# Altium footprint library con-amp.PCBLIB: 295 footprints (part 19 of 19)
Each footprint in its own frame and in the unit in brackets; x right, y up, seen from the top. Pads: shape width x height; smd on the part's side, far side on the other; paste and mask are expansions set on the pad; w line width, h text height; cw(c..) or ccw(c..) is an arc to the next point about the centre after c.
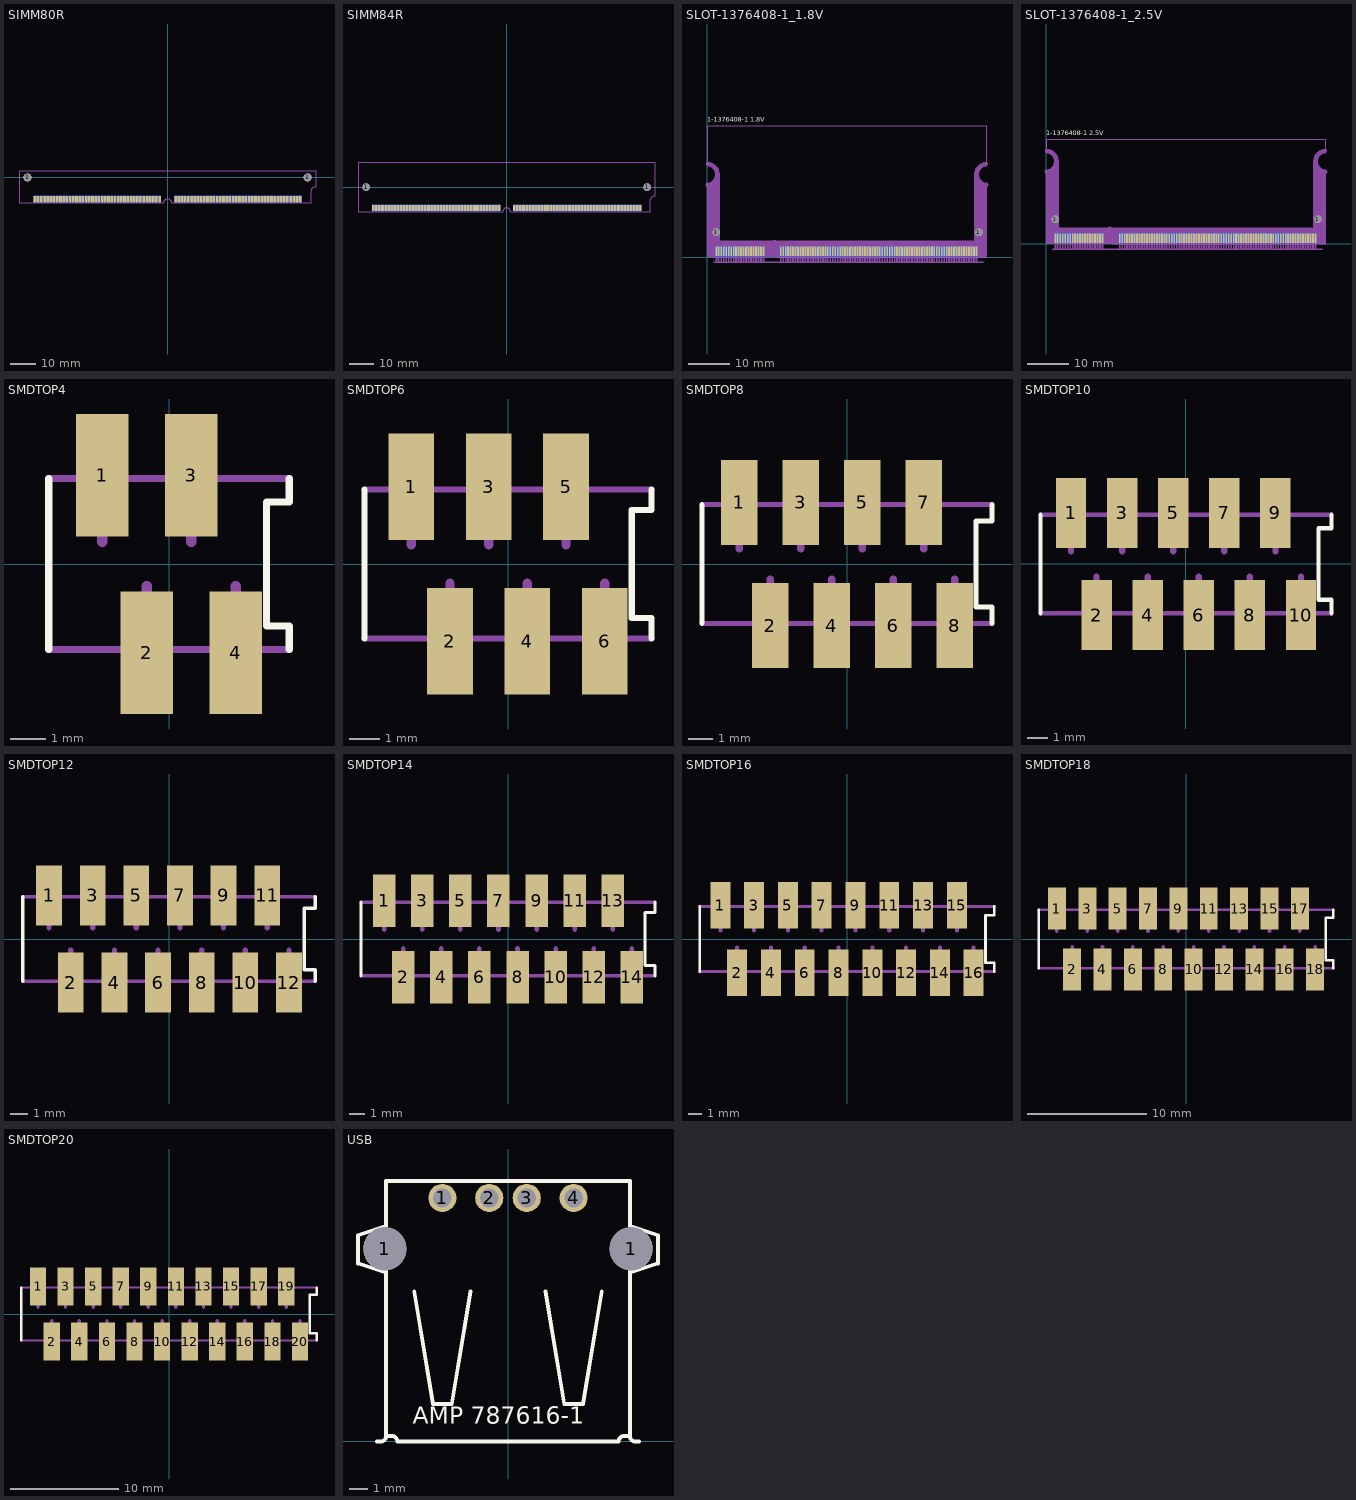
[diagram p18: the footprints below, top view; thin cyan lines are the x and y axes]

## SIMM80R [mil]
pads (162):
  round 125 hole 125: 1(-2192,0) 1(2192,0)
  rect 41x100 smd: 1(2075,-340) 2(2025,-340) 3(1975,-340) 4(1925,-340) 5(1875,-340) 6(1825,-340) 7(1775,-340) 8(1725,-340) 9(1675,-340) 10(1625,-340) 11(1575,-340) 12(1525,-340) 13(1475,-340) 14(1425,-340) 15(1375,-340) 16(1325,-340) 17(1275,-340) 18(1225,-340) 19(1175,-340) 20(1125,-340) 21(1075,-340) 22(1025,-340) 23(975,-340) 24(925,-340) 25(875,-340) 26(825,-340) 27(775,-340) 28(725,-340) 29(675,-340) 30(625,-340) 31(575,-340) 32(525,-340) 33(475,-340) 34(425,-340) 35(375,-340) 36(325,-340) 37(275,-340) 38(225,-340) 39(175,-340) 40(125,-340) 41(-125,-340) 42(-175,-340) 43(-225,-340) 44(-275,-340) 45(-325,-340) 46(-375,-340) 47(-425,-340) 48(-475,-340) 49(-525,-340) 50(-575,-340) 51(-625,-340) 52(-675,-340) 53(-725,-340) 54(-775,-340) 55(-825,-340) 56(-875,-340) 57(-925,-340) 58(-975,-340) 59(-1025,-340) 60(-1075,-340) 61(-1125,-340) 62(-1175,-340) 63(-1225,-340) 64(-1275,-340) 65(-1325,-340) 66(-1375,-340) 67(-1425,-340) 68(-1475,-340) 69(-1525,-340) 70(-1575,-340) 71(-1625,-340) 72(-1675,-340) 73(-1725,-340) 74(-1775,-340) 75(-1825,-340) 76(-1875,-340) 77(-1925,-340) 78(-1975,-340) 79(-2025,-340) 80(-2075,-340)
  rect 41x100 smd far side: 81(2075,-340) 82(2025,-340) 83(1975,-340) 84(1925,-340) 85(1875,-340) 86(1825,-340) 87(1775,-340) 88(1725,-340) 89(1675,-340) 90(1625,-340) 91(1575,-340) 92(1525,-340) 93(1475,-340) 94(1425,-340) 95(1375,-340) 96(1325,-340) 97(1275,-340) 98(1225,-340) 99(1175,-340) 100(1125,-340) 101(1075,-340) 102(1025,-340) 103(975,-340) 104(925,-340) 105(875,-340) 106(825,-340) 107(775,-340) 108(725,-340) 109(675,-340) 110(625,-340) 111(575,-340) 112(525,-340) 113(475,-340) 114(425,-340) 115(375,-340) 116(325,-340) 117(275,-340) 118(225,-340) 119(175,-340) 120(125,-340) 121(-125,-340) 122(-175,-340) 123(-225,-340) 124(-275,-340) 125(-325,-340) 126(-375,-340) 127(-425,-340) 128(-475,-340) 129(-525,-340) 130(-575,-340) 131(-625,-340) 132(-675,-340) 133(-725,-340) 134(-775,-340) 135(-825,-340) 136(-875,-340) 137(-925,-340) 138(-975,-340) 139(-1025,-340) 140(-1075,-340) 141(-1125,-340) 142(-1175,-340) 143(-1225,-340) 144(-1275,-340) 145(-1325,-340) 146(-1375,-340) 147(-1425,-340) 148(-1475,-340) 149(-1525,-340) 150(-1575,-340) 151(-1625,-340) 152(-1675,-340) 153(-1725,-340) 154(-1775,-340) 155(-1825,-340) 156(-1875,-340) 157(-1925,-340) 158(-1975,-340) 159(-2025,-340) 160(-2075,-340)
Mechanical 1:
  lines w0: 2245,-212 cw(c2307,-212) 2307,-150 ; 2245,-209 2245,-400 62,-400 ccw(c0,-400) -62,-400 -2325,-400 -2325,100 2325,100 2325,-150 2303,-150

## SIMM84R [mil]
pads (170):
  round 125 hole 125: 1(-2292,0) 1(2292,0)
  rect 42x100 smd: 1(2175,-340) 2(2125,-340) 3(2075,-340) 4(2025,-340) 5(1975,-340) 6(1925,-340) 7(1875,-340) 8(1825,-340) 9(1775,-340) 10(1725,-340) 11(1675,-340) 12(1625,-340) 13(1575,-340) 14(1525,-340) 15(1475,-340) 16(1425,-340) 17(1375,-340) 18(1325,-340) 19(1275,-340) 20(1225,-340) 21(1175,-340) 22(1125,-340) 23(1075,-340) 24(1025,-340) 25(975,-340) 26(925,-340) 27(875,-340) 28(825,-340) 29(775,-340) 30(725,-340) 31(675,-340) 32(625,-340) 33(575,-340) 34(525,-340) 35(475,-340) 36(425,-340) 37(375,-340) 38(325,-340) 39(275,-340) 40(225,-340) 41(175,-340) 42(125,-340) 43(-125,-340) 44(-175,-340) 45(-225,-340) 46(-275,-340) 47(-325,-340) 48(-375,-340) 49(-425,-340) 50(-475,-340) 51(-525,-340) 52(-575,-340) 53(-625,-340) 54(-675,-340) 55(-725,-340) 56(-775,-340) 57(-825,-340) 58(-875,-340) 59(-925,-340) 60(-975,-340) 61(-1025,-340) 62(-1075,-340) 63(-1125,-340) 64(-1175,-340) 65(-1225,-340) 66(-1275,-340) 67(-1325,-340) 68(-1375,-340) 69(-1425,-340) 70(-1475,-340) 71(-1525,-340) 72(-1575,-340) 73(-1625,-340) 74(-1675,-340) 75(-1725,-340) 76(-1775,-340) 77(-1825,-340) 78(-1875,-340) 79(-1925,-340) 80(-1975,-340) 81(-2025,-340) 82(-2075,-340) 83(-2125,-340) 84(-2175,-340)
  rect 42x100 smd far side: 85(2175,-340) 86(2125,-340) 87(2075,-340) 88(2025,-340) 89(1975,-340) 90(1925,-340) 91(1875,-340) 92(1825,-340) 93(1775,-340) 94(1725,-340) 95(1675,-340) 96(1625,-340) 97(1575,-340) 98(1525,-340) 99(1475,-340) 100(1425,-340) 101(1375,-340) 102(1325,-340) 103(1275,-340) 104(1225,-340) 105(1175,-340) 106(1125,-340) 107(1075,-340) 108(1025,-340) 109(975,-340) 110(925,-340) 111(875,-340) 112(825,-340) 113(775,-340) 114(725,-340) 115(675,-340) 116(625,-340) 117(575,-340) 118(525,-340) 119(475,-340) 120(425,-340) 121(375,-340) 122(325,-340) 123(275,-340) 124(225,-340) 125(175,-340) 126(125,-340) 127(-125,-340) 128(-175,-340) 129(-225,-340) 130(-275,-340) 131(-325,-340) 132(-375,-340) 133(-425,-340) 134(-475,-340) 135(-525,-340) 136(-575,-340) 137(-625,-340) 138(-675,-340) 139(-725,-340) 140(-775,-340) 141(-825,-340) 142(-875,-340) 143(-925,-340) 144(-975,-340) 145(-1025,-340) 146(-1075,-340) 147(-1125,-340) 148(-1175,-340) 149(-1225,-340) 150(-1275,-340) 151(-1325,-340) 152(-1375,-340) 153(-1425,-340) 154(-1475,-340) 155(-1525,-340) 156(-1575,-340) 157(-1625,-340) 158(-1675,-340) 159(-1725,-340) 160(-1775,-340) 161(-1825,-340) 162(-1875,-340) 163(-1925,-340) 164(-1975,-340) 165(-2025,-340) 166(-2075,-340) 167(-2125,-340) 168(-2175,-340)
Mechanical 1:
  lines w0: 2345,-212 cw(c2407,-212) 2407,-150 ; 2345,-209 2345,-400 62,-400 ccw(c0,-400) -62,-400 -2425,-400 -2425,400 2425,400 2425,-150 2403,-150

## SLOT-1376408-1_1.8V [mm]
pads (202):
  rect 0.45x2.3 smd: 1(2.15,1.4) 3(2.75,1.4) 5(3.35,1.4) 7(3.95,1.4) 9(4.55,1.4) 11(5.15,1.4) 13(5.75,1.4) 15(6.35,1.4) 17(6.95,1.4) 19(7.55,1.4) 21(8.15,1.4) 23(8.75,1.4) 25(9.35,1.4) 27(9.95,1.4) 29(10.55,1.4) 31(11.15,1.4) 33(11.75,1.4) 35(12.35,1.4) 37(12.95,1.4) 39(13.55,1.4) 41(17.75,1.4) 43(18.35,1.4) 45(18.95,1.4) 47(19.55,1.4) 49(20.15,1.4) 51(20.75,1.4) 53(21.35,1.4) 55(21.95,1.4) 57(22.55,1.4) 59(23.15,1.4) 61(23.75,1.4) 63(24.35,1.4) 65(24.95,1.4) 67(25.55,1.4) 69(26.15,1.4) 71(26.75,1.4) 73(27.35,1.4) 75(27.95,1.4) 77(28.55,1.4) 79(29.15,1.4) 81(29.75,1.4) 83(30.35,1.4) 85(30.95,1.4) 87(31.55,1.4) 89(32.15,1.4) 91(32.75,1.4) 93(33.35,1.4) 95(33.95,1.4) 97(34.55,1.4) 99(35.15,1.4) 101(35.75,1.4) 103(36.35,1.4) 105(36.95,1.4) 107(37.55,1.4) 109(38.15,1.4) 111(38.75,1.4) 113(39.35,1.4) 115(39.95,1.4) 117(40.55,1.4) 119(41.15,1.4) 121(41.75,1.4) 123(42.35,1.4) 125(42.95,1.4) 127(43.55,1.4) 129(44.15,1.4) 131(44.75,1.4) 133(45.35,1.4) 135(45.95,1.4) 137(46.55,1.4) 139(47.15,1.4) 141(47.75,1.4) 143(48.35,1.4) 145(48.95,1.4) 147(49.55,1.4) 149(50.15,1.4) 151(50.75,1.4) 153(51.35,1.4) 155(51.95,1.4) 157(52.55,1.4) 159(53.15,1.4) 161(53.75,1.4) 163(54.35,1.4) 165(54.95,1.4) 167(55.55,1.4) 169(56.15,1.4) 171(56.75,1.4) 173(57.35,1.4) 175(57.95,1.4) 177(58.55,1.4) 179(59.15,1.4) 181(59.75,1.4) 183(60.35,1.4) 185(60.95,1.4) 187(61.55,1.4) 189(62.15,1.4) 191(62.75,1.4) 193(63.35,1.4) 195(63.95,1.4) 197(64.55,1.4) 199(65.15,1.4)
  round 1.8 hole 1.8: 1(2.15,6) 1(65.75,6)
  rect 0.45x2.3 smd far side: 2(2.15,1.4) 4(2.75,1.4) 6(3.35,1.4) 8(3.95,1.4) 10(4.55,1.4) 12(5.15,1.4) 14(5.75,1.4) 16(6.35,1.4) 18(6.95,1.4) 20(7.55,1.4) 22(8.15,1.4) 24(8.75,1.4) 26(9.35,1.4) 28(9.95,1.4) 30(10.55,1.4) 32(11.15,1.4) 34(11.75,1.4) 36(12.35,1.4) 38(12.95,1.4) 40(13.55,1.4) 42(17.75,1.4) 44(18.35,1.4) 46(18.95,1.4) 48(19.55,1.4) 50(20.15,1.4) 52(20.75,1.4) 54(21.35,1.4) 56(21.95,1.4) 58(22.55,1.4) 60(23.15,1.4) 62(23.75,1.4) 64(24.35,1.4) 66(24.95,1.4) 68(25.55,1.4) 70(26.15,1.4) 72(26.75,1.4) 74(27.35,1.4) 76(27.95,1.4) 78(28.55,1.4) 80(29.15,1.4) 82(29.75,1.4) 84(30.35,1.4) 86(30.95,1.4) 88(31.55,1.4) 90(32.15,1.4) 92(32.75,1.4) 94(33.35,1.4) 96(33.95,1.4) 98(34.55,1.4) 100(35.15,1.4) 102(35.75,1.4) 104(36.35,1.4) 106(36.95,1.4) 108(37.55,1.4) 110(38.15,1.4) 112(38.75,1.4) 114(39.35,1.4) 116(39.95,1.4) 118(40.55,1.4) 120(41.15,1.4) 122(41.75,1.4) 124(42.35,1.4) 126(42.95,1.4) 128(43.55,1.4) 130(44.15,1.4) 132(44.75,1.4) 134(45.35,1.4) 136(45.95,1.4) 138(46.55,1.4) 140(47.15,1.4) 142(47.75,1.4) 144(48.35,1.4) 146(48.95,1.4) 148(49.55,1.4) 150(50.15,1.4) 152(50.75,1.4) 154(51.35,1.4) 156(51.95,1.4) 158(52.55,1.4) 160(53.15,1.4) 162(53.75,1.4) 164(54.35,1.4) 166(54.95,1.4) 168(55.55,1.4) 170(56.15,1.4) 172(56.75,1.4) 174(57.35,1.4) 176(57.95,1.4) 178(58.55,1.4) 180(59.15,1.4) 182(59.75,1.4) 184(60.35,1.4) 186(60.95,1.4) 188(61.55,1.4) 190(62.15,1.4) 192(62.75,1.4) 194(63.35,1.4) 196(63.95,1.4) 198(64.55,1.4) 200(65.15,1.4)
Top Overlay:
  text "1-1376408-1 1.8V" at 0,32.25 h1.97
Mechanical 1:
  lines w0: 0,0 15.75,0 15.75,3.5 cw(c16.25,3.5) 16.75,3.5 16.75,0 67.6,0 67.6,18 cw(c67.6,20) 67.6,22 67.6,31.75 0,31.75 0,22 cw(c0,20) 0,18 0,0
Mechanical 23:
  lines w0.4: 1.5,-1.25 66.75,-1.25
  lines w0.45: 2.15,-1.15 2.15,2.35 ; 2.75,-1.15 2.75,2.35 ; 3.35,-1.15 3.35,2.35 ; 3.95,-1.15 3.95,2.35 ; 4.55,-1.15 4.55,2.35 ; 5.15,-1.15 5.15,2.35 ; 5.75,-1.15 5.75,2.35 ; 6.35,-1.15 6.35,2.35 ; 6.95,-1.15 6.95,2.35 ; 7.55,-1.15 7.55,2.35 ; 8.15,-1.15 8.15,2.35 ; 8.75,-1.15 8.75,2.35 ; 9.35,-1.15 9.35,2.35 ; 9.95,-1.15 9.95,2.35 ; 10.55,-1.15 10.55,2.35 ; 11.15,-1.15 11.15,2.35 ; 11.75,-1.15 11.75,2.35 ; 12.35,-1.15 12.35,2.35 ; 12.95,-1.15 12.95,2.35 ; 13.55,-1.15 13.55,2.35 ; 17.75,-1.15 17.75,2.35 ; 18.35,-1.15 18.35,2.35 ; 18.95,-1.15 18.95,2.35 ; 19.55,-1.15 19.55,2.35 ; 20.15,-1.15 20.15,2.35 ; 20.75,-1.15 20.75,2.35 ; 21.35,-1.15 21.35,2.35 ; 21.95,-1.15 21.95,2.35 ; 22.55,-1.15 22.55,2.35 ; 23.15,-1.15 23.15,2.35 ; 23.75,-1.15 23.75,2.35 ; 24.35,-1.15 24.35,2.35 ; 24.95,-1.15 24.95,2.35 ; 25.55,-1.15 25.55,2.35 ; 26.15,-1.15 26.15,2.35 ; 26.75,-1.15 26.75,2.35 ; 27.35,-1.15 27.35,2.35 ; 27.95,-1.15 27.95,2.35 ; 28.55,-1.15 28.55,2.35 ; 29.15,-1.15 29.15,2.35 ; 29.75,-1.15 29.75,2.35 ; 30.35,-1.15 30.35,2.35 ; 30.95,-1.15 30.95,2.35 ; 31.55,-1.15 31.55,2.35 ; 32.15,-1.15 32.15,2.35 ; 32.75,-1.15 32.75,2.35 ; 33.35,-1.15 33.35,2.35 ; 33.95,-1.15 33.95,2.35 ; 34.55,-1.15 34.55,2.35 ; 35.15,-1.15 35.15,2.35 ; 35.75,-1.15 35.75,2.35 ; 36.35,-1.15 36.35,2.35 ; 36.95,-1.15 36.95,2.35 ; 37.55,-1.15 37.55,2.35 ; 38.15,-1.15 38.15,2.35 ; 38.75,-1.15 38.75,2.35 ; 39.35,-1.15 39.35,2.35 ; 39.95,-1.15 39.95,2.35 ; 40.55,-1.15 40.55,2.35 ; 41.15,-1.15 41.15,2.35 ; 41.75,-1.15 41.75,2.35 ; 42.35,-1.15 42.35,2.35 ; 42.95,-1.15 42.95,2.35 ; 43.55,-1.15 43.55,2.35 ; 44.15,-1.15 44.15,2.35 ; 44.75,-1.15 44.75,2.35 ; 45.35,-1.15 45.35,2.35 ; 45.95,-1.15 45.95,2.35 ; 46.55,-1.15 46.55,2.35 ; 47.15,-1.15 47.15,2.35 ; 47.75,-1.15 47.75,2.35 ; 48.35,-1.15 48.35,2.35 ; 48.95,-1.15 48.95,2.35 ; 49.55,-1.15 49.55,2.35 ; 50.15,-1.15 50.15,2.35 ; 50.75,-1.15 50.75,2.35 ; 51.35,-1.15 51.35,2.35 ; 51.95,-1.15 51.95,2.35 ; 52.55,-1.15 52.55,2.35 ; 53.15,-1.15 53.15,2.35 ; 53.75,-1.15 53.75,2.35 ; 54.35,-1.15 54.35,2.35 ; 54.95,-1.15 54.95,2.35 ; 55.55,-1.15 55.55,2.35 ; 56.15,-1.15 56.15,2.35 ; 56.75,-1.15 56.75,2.35 ; 57.35,-1.15 57.35,2.35 ; 57.95,-1.15 57.95,2.35 ; 58.55,-1.15 58.55,2.35 ; 59.15,-1.15 59.15,2.35 ; 59.75,-1.15 59.75,2.35 ; 60.35,-1.15 60.35,2.35 ; 60.95,-1.15 60.95,2.35 ; 61.55,-1.15 61.55,2.35 ; 62.15,-1.15 62.15,2.35 ; 62.75,-1.15 62.75,2.35 ; 63.35,-1.15 63.35,2.35 ; 63.95,-1.15 63.95,2.35 ; 64.55,-1.15 64.55,2.35 ; 65.15,-1.15 65.15,2.35
Mechanical 24:
  lines w0.4: 1.5,-1.25 66.75,-1.25
  lines w0.45: 2.15,-1.15 2.15,2.35 ; 2.75,-1.15 2.75,2.35 ; 3.35,-1.15 3.35,2.35 ; 3.95,-1.15 3.95,2.35 ; 4.55,-1.15 4.55,2.35 ; 5.15,-1.15 5.15,2.35 ; 5.75,-1.15 5.75,2.35 ; 6.35,-1.15 6.35,2.35 ; 6.95,-1.15 6.95,2.35 ; 7.55,-1.15 7.55,2.35 ; 8.15,-1.15 8.15,2.35 ; 8.75,-1.15 8.75,2.35 ; 9.35,-1.15 9.35,2.35 ; 9.95,-1.15 9.95,2.35 ; 10.55,-1.15 10.55,2.35 ; 11.15,-1.15 11.15,2.35 ; 11.75,-1.15 11.75,2.35 ; 12.35,-1.15 12.35,2.35 ; 12.95,-1.15 12.95,2.35 ; 13.55,-1.15 13.55,2.35 ; 17.75,-1.15 17.75,2.35 ; 18.35,-1.15 18.35,2.35 ; 18.95,-1.15 18.95,2.35 ; 19.55,-1.15 19.55,2.35 ; 20.15,-1.15 20.15,2.35 ; 20.75,-1.15 20.75,2.35 ; 21.35,-1.15 21.35,2.35 ; 21.95,-1.15 21.95,2.35 ; 22.55,-1.15 22.55,2.35 ; 23.15,-1.15 23.15,2.35 ; 23.75,-1.15 23.75,2.35 ; 24.35,-1.15 24.35,2.35 ; 24.95,-1.15 24.95,2.35 ; 25.55,-1.15 25.55,2.35 ; 26.15,-1.15 26.15,2.35 ; 26.75,-1.15 26.75,2.35 ; 27.35,-1.15 27.35,2.35 ; 27.95,-1.15 27.95,2.35 ; 28.55,-1.15 28.55,2.35 ; 29.15,-1.15 29.15,2.35 ; 29.75,-1.15 29.75,2.35 ; 30.35,-1.15 30.35,2.35 ; 30.95,-1.15 30.95,2.35 ; 31.55,-1.15 31.55,2.35 ; 32.15,-1.15 32.15,2.35 ; 32.75,-1.15 32.75,2.35 ; 33.35,-1.15 33.35,2.35 ; 33.95,-1.15 33.95,2.35 ; 34.55,-1.15 34.55,2.35 ; 35.15,-1.15 35.15,2.35 ; 35.75,-1.15 35.75,2.35 ; 36.35,-1.15 36.35,2.35 ; 36.95,-1.15 36.95,2.35 ; 37.55,-1.15 37.55,2.35 ; 38.15,-1.15 38.15,2.35 ; 38.75,-1.15 38.75,2.35 ; 39.35,-1.15 39.35,2.35 ; 39.95,-1.15 39.95,2.35 ; 40.55,-1.15 40.55,2.35 ; 41.15,-1.15 41.15,2.35 ; 41.75,-1.15 41.75,2.35 ; 42.35,-1.15 42.35,2.35 ; 42.95,-1.15 42.95,2.35 ; 43.55,-1.15 43.55,2.35 ; 44.15,-1.15 44.15,2.35 ; 44.75,-1.15 44.75,2.35 ; 45.35,-1.15 45.35,2.35 ; 45.95,-1.15 45.95,2.35 ; 46.55,-1.15 46.55,2.35 ; 47.15,-1.15 47.15,2.35 ; 47.75,-1.15 47.75,2.35 ; 48.35,-1.15 48.35,2.35 ; 48.95,-1.15 48.95,2.35 ; 49.55,-1.15 49.55,2.35 ; 50.15,-1.15 50.15,2.35 ; 50.75,-1.15 50.75,2.35 ; 51.35,-1.15 51.35,2.35 ; 51.95,-1.15 51.95,2.35 ; 52.55,-1.15 52.55,2.35 ; 53.15,-1.15 53.15,2.35 ; 53.75,-1.15 53.75,2.35 ; 54.35,-1.15 54.35,2.35 ; 54.95,-1.15 54.95,2.35 ; 55.55,-1.15 55.55,2.35 ; 56.15,-1.15 56.15,2.35 ; 56.75,-1.15 56.75,2.35 ; 57.35,-1.15 57.35,2.35 ; 57.95,-1.15 57.95,2.35 ; 58.55,-1.15 58.55,2.35 ; 59.15,-1.15 59.15,2.35 ; 59.75,-1.15 59.75,2.35 ; 60.35,-1.15 60.35,2.35 ; 60.95,-1.15 60.95,2.35 ; 61.55,-1.15 61.55,2.35 ; 62.15,-1.15 62.15,2.35 ; 62.75,-1.15 62.75,2.35 ; 63.35,-1.15 63.35,2.35 ; 63.95,-1.15 63.95,2.35 ; 64.55,-1.15 64.55,2.35 ; 65.15,-1.15 65.15,2.35
Mechanical 27:
  lines w1: 0.5,17.55 0.5,0.5 2.5,0.5 2.5,20 ; 1.5,1.15 1.5,17.35 ; 65.1,20.1 cw(c67.616,19.991) 67.4,22.5 ; 66.1,1.15 66.1,17.35 ; 67.1,17.55 67.1,0.5 65.1,0.5 65.1,20 ccw(c67.561,19.961) 67.6,17.5 ; 0,17.5 ccw(c0.039,19.961) 2.5,20 ; 0,17.5 ccw(c0.039,19.961) 2.5,20 ; 0,17.5 ccw(c0.039,19.961) 2.5,20 ; 0.2,22.5 cw(c-0.016,19.991) 2.5,20.1 ; 0.2,22.5 cw(c-0.016,19.991) 2.5,20.1 ; 0.2,22.5 cw(c-0.016,19.991) 2.5,20.1
  lines w4: 3.5,2 64,2
Mechanical 28:
  lines w1: 0,17.5 ccw(c0.039,19.961) 2.5,20 2.5,0.5 0.5,0.5 0.5,17.55 ; 0.2,22.5 cw(c-0.016,19.991) 2.5,20.1 ; 1.5,1.15 1.5,17.35 ; 66.1,1.15 66.1,17.35 ; 67.1,17.55 67.1,0.5 65.1,0.5 65.1,20 ; 65.1,20 ccw(c67.561,19.961) 67.6,17.5 ; 65.1,20 ccw(c67.561,19.961) 67.6,17.5 ; 65.1,20 ccw(c67.561,19.961) 67.6,17.5 ; 65.1,20.1 cw(c67.616,19.991) 67.4,22.5 ; 65.1,20.1 cw(c67.616,19.991) 67.4,22.5 ; 65.1,20.1 cw(c67.616,19.991) 67.4,22.5
  lines w4: 3.5,2 64,2

## SLOT-1376408-1_2.5V [mm]
pads (202):
  rect 0.45x2.3 smd: 1(2.15,1.4) 3(2.75,1.4) 5(3.35,1.4) 7(3.95,1.4) 9(4.55,1.4) 11(5.15,1.4) 13(5.75,1.4) 15(6.35,1.4) 17(6.95,1.4) 19(7.55,1.4) 21(8.15,1.4) 23(8.75,1.4) 25(9.35,1.4) 27(9.95,1.4) 29(10.55,1.4) 31(11.15,1.4) 33(11.75,1.4) 35(12.35,1.4) 37(12.95,1.4) 39(13.55,1.4) 41(17.75,1.4) 43(18.35,1.4) 45(18.95,1.4) 47(19.55,1.4) 49(20.15,1.4) 51(20.75,1.4) 53(21.35,1.4) 55(21.95,1.4) 57(22.55,1.4) 59(23.15,1.4) 61(23.75,1.4) 63(24.35,1.4) 65(24.95,1.4) 67(25.55,1.4) 69(26.15,1.4) 71(26.75,1.4) 73(27.35,1.4) 75(27.95,1.4) 77(28.55,1.4) 79(29.15,1.4) 81(29.75,1.4) 83(30.35,1.4) 85(30.95,1.4) 87(31.55,1.4) 89(32.15,1.4) 91(32.75,1.4) 93(33.35,1.4) 95(33.95,1.4) 97(34.55,1.4) 99(35.15,1.4) 101(35.75,1.4) 103(36.35,1.4) 105(36.95,1.4) 107(37.55,1.4) 109(38.15,1.4) 111(38.75,1.4) 113(39.35,1.4) 115(39.95,1.4) 117(40.55,1.4) 119(41.15,1.4) 121(41.75,1.4) 123(42.35,1.4) 125(42.95,1.4) 127(43.55,1.4) 129(44.15,1.4) 131(44.75,1.4) 133(45.35,1.4) 135(45.95,1.4) 137(46.55,1.4) 139(47.15,1.4) 141(47.75,1.4) 143(48.35,1.4) 145(48.95,1.4) 147(49.55,1.4) 149(50.15,1.4) 151(50.75,1.4) 153(51.35,1.4) 155(51.95,1.4) 157(52.55,1.4) 159(53.15,1.4) 161(53.75,1.4) 163(54.35,1.4) 165(54.95,1.4) 167(55.55,1.4) 169(56.15,1.4) 171(56.75,1.4) 173(57.35,1.4) 175(57.95,1.4) 177(58.55,1.4) 179(59.15,1.4) 181(59.75,1.4) 183(60.35,1.4) 185(60.95,1.4) 187(61.55,1.4) 189(62.15,1.4) 191(62.75,1.4) 193(63.35,1.4) 195(63.95,1.4) 197(64.55,1.4) 199(65.15,1.4)
  round 1.8 hole 1.8: 1(2.15,6) 1(65.75,6)
  rect 0.45x2.3 smd far side: 2(2.15,1.4) 4(2.75,1.4) 6(3.35,1.4) 8(3.95,1.4) 10(4.55,1.4) 12(5.15,1.4) 14(5.75,1.4) 16(6.35,1.4) 18(6.95,1.4) 20(7.55,1.4) 22(8.15,1.4) 24(8.75,1.4) 26(9.35,1.4) 28(9.95,1.4) 30(10.55,1.4) 32(11.15,1.4) 34(11.75,1.4) 36(12.35,1.4) 38(12.95,1.4) 40(13.55,1.4) 42(17.75,1.4) 44(18.35,1.4) 46(18.95,1.4) 48(19.55,1.4) 50(20.15,1.4) 52(20.75,1.4) 54(21.35,1.4) 56(21.95,1.4) 58(22.55,1.4) 60(23.15,1.4) 62(23.75,1.4) 64(24.35,1.4) 66(24.95,1.4) 68(25.55,1.4) 70(26.15,1.4) 72(26.75,1.4) 74(27.35,1.4) 76(27.95,1.4) 78(28.55,1.4) 80(29.15,1.4) 82(29.75,1.4) 84(30.35,1.4) 86(30.95,1.4) 88(31.55,1.4) 90(32.15,1.4) 92(32.75,1.4) 94(33.35,1.4) 96(33.95,1.4) 98(34.55,1.4) 100(35.15,1.4) 102(35.75,1.4) 104(36.35,1.4) 106(36.95,1.4) 108(37.55,1.4) 110(38.15,1.4) 112(38.75,1.4) 114(39.35,1.4) 116(39.95,1.4) 118(40.55,1.4) 120(41.15,1.4) 122(41.75,1.4) 124(42.35,1.4) 126(42.95,1.4) 128(43.55,1.4) 130(44.15,1.4) 132(44.75,1.4) 134(45.35,1.4) 136(45.95,1.4) 138(46.55,1.4) 140(47.15,1.4) 142(47.75,1.4) 144(48.35,1.4) 146(48.95,1.4) 148(49.55,1.4) 150(50.15,1.4) 152(50.75,1.4) 154(51.35,1.4) 156(51.95,1.4) 158(52.55,1.4) 160(53.15,1.4) 162(53.75,1.4) 164(54.35,1.4) 166(54.95,1.4) 168(55.55,1.4) 170(56.15,1.4) 172(56.75,1.4) 174(57.35,1.4) 176(57.95,1.4) 178(58.55,1.4) 180(59.15,1.4) 182(59.75,1.4) 184(60.35,1.4) 186(60.95,1.4) 188(61.55,1.4) 190(62.15,1.4) 192(62.75,1.4) 194(63.35,1.4) 196(63.95,1.4) 198(64.55,1.4) 200(65.15,1.4)
Top Overlay:
  text "1-1376408-1 2.5V" at 0,25.9 h1.97
Mechanical 1:
  lines w0: 0,0 14.85,0 14.85,3.5 cw(c15.35,3.5) 15.85,3.5 15.85,0 67.6,0 67.6,18 cw(c67.6,20) 67.6,22 67.6,25.4 0,25.4 0,22 cw(c0,20) 0,18 0,0
Mechanical 23:
  lines w0.4: 1.5,-1.25 66.75,-1.25
  lines w0.45: 2.15,-1.15 2.15,2.35 ; 2.75,-1.15 2.75,2.35 ; 3.35,-1.15 3.35,2.35 ; 3.95,-1.15 3.95,2.35 ; 4.55,-1.15 4.55,2.35 ; 5.15,-1.15 5.15,2.35 ; 5.75,-1.15 5.75,2.35 ; 6.35,-1.15 6.35,2.35 ; 6.95,-1.15 6.95,2.35 ; 7.55,-1.15 7.55,2.35 ; 8.15,-1.15 8.15,2.35 ; 8.75,-1.15 8.75,2.35 ; 9.35,-1.15 9.35,2.35 ; 9.95,-1.15 9.95,2.35 ; 10.55,-1.15 10.55,2.35 ; 11.15,-1.15 11.15,2.35 ; 11.75,-1.15 11.75,2.35 ; 12.35,-1.15 12.35,2.35 ; 12.95,-1.15 12.95,2.35 ; 13.55,-1.15 13.55,2.35 ; 17.75,-1.15 17.75,2.35 ; 18.35,-1.15 18.35,2.35 ; 18.95,-1.15 18.95,2.35 ; 19.55,-1.15 19.55,2.35 ; 20.15,-1.15 20.15,2.35 ; 20.75,-1.15 20.75,2.35 ; 21.35,-1.15 21.35,2.35 ; 21.95,-1.15 21.95,2.35 ; 22.55,-1.15 22.55,2.35 ; 23.15,-1.15 23.15,2.35 ; 23.75,-1.15 23.75,2.35 ; 24.35,-1.15 24.35,2.35 ; 24.95,-1.15 24.95,2.35 ; 25.55,-1.15 25.55,2.35 ; 26.15,-1.15 26.15,2.35 ; 26.75,-1.15 26.75,2.35 ; 27.35,-1.15 27.35,2.35 ; 27.95,-1.15 27.95,2.35 ; 28.55,-1.15 28.55,2.35 ; 29.15,-1.15 29.15,2.35 ; 29.75,-1.15 29.75,2.35 ; 30.35,-1.15 30.35,2.35 ; 30.95,-1.15 30.95,2.35 ; 31.55,-1.15 31.55,2.35 ; 32.15,-1.15 32.15,2.35 ; 32.75,-1.15 32.75,2.35 ; 33.35,-1.15 33.35,2.35 ; 33.95,-1.15 33.95,2.35 ; 34.55,-1.15 34.55,2.35 ; 35.15,-1.15 35.15,2.35 ; 35.75,-1.15 35.75,2.35 ; 36.35,-1.15 36.35,2.35 ; 36.95,-1.15 36.95,2.35 ; 37.55,-1.15 37.55,2.35 ; 38.15,-1.15 38.15,2.35 ; 38.75,-1.15 38.75,2.35 ; 39.35,-1.15 39.35,2.35 ; 39.95,-1.15 39.95,2.35 ; 40.55,-1.15 40.55,2.35 ; 41.15,-1.15 41.15,2.35 ; 41.75,-1.15 41.75,2.35 ; 42.35,-1.15 42.35,2.35 ; 42.95,-1.15 42.95,2.35 ; 43.55,-1.15 43.55,2.35 ; 44.15,-1.15 44.15,2.35 ; 44.75,-1.15 44.75,2.35 ; 45.35,-1.15 45.35,2.35 ; 45.95,-1.15 45.95,2.35 ; 46.55,-1.15 46.55,2.35 ; 47.15,-1.15 47.15,2.35 ; 47.75,-1.15 47.75,2.35 ; 48.35,-1.15 48.35,2.35 ; 48.95,-1.15 48.95,2.35 ; 49.55,-1.15 49.55,2.35 ; 50.15,-1.15 50.15,2.35 ; 50.75,-1.15 50.75,2.35 ; 51.35,-1.15 51.35,2.35 ; 51.95,-1.15 51.95,2.35 ; 52.55,-1.15 52.55,2.35 ; 53.15,-1.15 53.15,2.35 ; 53.75,-1.15 53.75,2.35 ; 54.35,-1.15 54.35,2.35 ; 54.95,-1.15 54.95,2.35 ; 55.55,-1.15 55.55,2.35 ; 56.15,-1.15 56.15,2.35 ; 56.75,-1.15 56.75,2.35 ; 57.35,-1.15 57.35,2.35 ; 57.95,-1.15 57.95,2.35 ; 58.55,-1.15 58.55,2.35 ; 59.15,-1.15 59.15,2.35 ; 59.75,-1.15 59.75,2.35 ; 60.35,-1.15 60.35,2.35 ; 60.95,-1.15 60.95,2.35 ; 61.55,-1.15 61.55,2.35 ; 62.15,-1.15 62.15,2.35 ; 62.75,-1.15 62.75,2.35 ; 63.35,-1.15 63.35,2.35 ; 63.95,-1.15 63.95,2.35 ; 64.55,-1.15 64.55,2.35 ; 65.15,-1.15 65.15,2.35
Mechanical 24:
  lines w0.4: 1.5,-1.25 66.75,-1.25
  lines w0.45: 2.15,-1.15 2.15,2.35 ; 2.75,-1.15 2.75,2.35 ; 3.35,-1.15 3.35,2.35 ; 3.95,-1.15 3.95,2.35 ; 4.55,-1.15 4.55,2.35 ; 5.15,-1.15 5.15,2.35 ; 5.75,-1.15 5.75,2.35 ; 6.35,-1.15 6.35,2.35 ; 6.95,-1.15 6.95,2.35 ; 7.55,-1.15 7.55,2.35 ; 8.15,-1.15 8.15,2.35 ; 8.75,-1.15 8.75,2.35 ; 9.35,-1.15 9.35,2.35 ; 9.95,-1.15 9.95,2.35 ; 10.55,-1.15 10.55,2.35 ; 11.15,-1.15 11.15,2.35 ; 11.75,-1.15 11.75,2.35 ; 12.35,-1.15 12.35,2.35 ; 12.95,-1.15 12.95,2.35 ; 13.55,-1.15 13.55,2.35 ; 17.75,-1.15 17.75,2.35 ; 18.35,-1.15 18.35,2.35 ; 18.95,-1.15 18.95,2.35 ; 19.55,-1.15 19.55,2.35 ; 20.15,-1.15 20.15,2.35 ; 20.75,-1.15 20.75,2.35 ; 21.35,-1.15 21.35,2.35 ; 21.95,-1.15 21.95,2.35 ; 22.55,-1.15 22.55,2.35 ; 23.15,-1.15 23.15,2.35 ; 23.75,-1.15 23.75,2.35 ; 24.35,-1.15 24.35,2.35 ; 24.95,-1.15 24.95,2.35 ; 25.55,-1.15 25.55,2.35 ; 26.15,-1.15 26.15,2.35 ; 26.75,-1.15 26.75,2.35 ; 27.35,-1.15 27.35,2.35 ; 27.95,-1.15 27.95,2.35 ; 28.55,-1.15 28.55,2.35 ; 29.15,-1.15 29.15,2.35 ; 29.75,-1.15 29.75,2.35 ; 30.35,-1.15 30.35,2.35 ; 30.95,-1.15 30.95,2.35 ; 31.55,-1.15 31.55,2.35 ; 32.15,-1.15 32.15,2.35 ; 32.75,-1.15 32.75,2.35 ; 33.35,-1.15 33.35,2.35 ; 33.95,-1.15 33.95,2.35 ; 34.55,-1.15 34.55,2.35 ; 35.15,-1.15 35.15,2.35 ; 35.75,-1.15 35.75,2.35 ; 36.35,-1.15 36.35,2.35 ; 36.95,-1.15 36.95,2.35 ; 37.55,-1.15 37.55,2.35 ; 38.15,-1.15 38.15,2.35 ; 38.75,-1.15 38.75,2.35 ; 39.35,-1.15 39.35,2.35 ; 39.95,-1.15 39.95,2.35 ; 40.55,-1.15 40.55,2.35 ; 41.15,-1.15 41.15,2.35 ; 41.75,-1.15 41.75,2.35 ; 42.35,-1.15 42.35,2.35 ; 42.95,-1.15 42.95,2.35 ; 43.55,-1.15 43.55,2.35 ; 44.15,-1.15 44.15,2.35 ; 44.75,-1.15 44.75,2.35 ; 45.35,-1.15 45.35,2.35 ; 45.95,-1.15 45.95,2.35 ; 46.55,-1.15 46.55,2.35 ; 47.15,-1.15 47.15,2.35 ; 47.75,-1.15 47.75,2.35 ; 48.35,-1.15 48.35,2.35 ; 48.95,-1.15 48.95,2.35 ; 49.55,-1.15 49.55,2.35 ; 50.15,-1.15 50.15,2.35 ; 50.75,-1.15 50.75,2.35 ; 51.35,-1.15 51.35,2.35 ; 51.95,-1.15 51.95,2.35 ; 52.55,-1.15 52.55,2.35 ; 53.15,-1.15 53.15,2.35 ; 53.75,-1.15 53.75,2.35 ; 54.35,-1.15 54.35,2.35 ; 54.95,-1.15 54.95,2.35 ; 55.55,-1.15 55.55,2.35 ; 56.15,-1.15 56.15,2.35 ; 56.75,-1.15 56.75,2.35 ; 57.35,-1.15 57.35,2.35 ; 57.95,-1.15 57.95,2.35 ; 58.55,-1.15 58.55,2.35 ; 59.15,-1.15 59.15,2.35 ; 59.75,-1.15 59.75,2.35 ; 60.35,-1.15 60.35,2.35 ; 60.95,-1.15 60.95,2.35 ; 61.55,-1.15 61.55,2.35 ; 62.15,-1.15 62.15,2.35 ; 62.75,-1.15 62.75,2.35 ; 63.35,-1.15 63.35,2.35 ; 63.95,-1.15 63.95,2.35 ; 64.55,-1.15 64.55,2.35 ; 65.15,-1.15 65.15,2.35
Mechanical 27:
  lines w1: 0.5,17.55 0.5,0.5 2.5,0.5 2.5,20 ; 1.5,1.15 1.5,17.35 ; 65.1,20.1 cw(c67.616,19.991) 67.4,22.5 ; 66.1,1.15 66.1,17.35 ; 67.1,17.55 67.1,0.5 65.1,0.5 65.1,20 ccw(c67.561,19.961) 67.6,17.5 ; 0,17.5 ccw(c0.039,19.961) 2.5,20 ; 0,17.5 ccw(c0.039,19.961) 2.5,20 ; 0,17.5 ccw(c0.039,19.961) 2.5,20 ; 0.2,22.5 cw(c-0.016,19.991) 2.5,20.1 ; 0.2,22.5 cw(c-0.016,19.991) 2.5,20.1 ; 0.2,22.5 cw(c-0.016,19.991) 2.5,20.1
  lines w4: 3.5,2 64,2
Mechanical 28:
  lines w1: 0,17.5 ccw(c0.039,19.961) 2.5,20 2.5,0.5 0.5,0.5 0.5,17.55 ; 0.2,22.5 cw(c-0.016,19.991) 2.5,20.1 ; 1.5,1.15 1.5,17.35 ; 66.1,1.15 66.1,17.35 ; 67.1,17.55 67.1,0.5 65.1,0.5 65.1,20 ; 65.1,20 ccw(c67.561,19.961) 67.6,17.5 ; 65.1,20 ccw(c67.561,19.961) 67.6,17.5 ; 65.1,20 ccw(c67.561,19.961) 67.6,17.5 ; 65.1,20.1 cw(c67.616,19.991) 67.4,22.5 ; 65.1,20.1 cw(c67.616,19.991) 67.4,22.5 ; 65.1,20.1 cw(c67.616,19.991) 67.4,22.5
  lines w4: 3.5,2 64,2

## SMDTOP4 [mil]
pads (4):
  rect 59.06x137.8 smd: 1(-75,100) 2(-25,-100) 3(25,100) 4(75,-100)
Top Overlay:
  lines w8: -135.43,-96.46 -135.43,96.46 ; 135.43,-96.46 135.43,-70 110,-70 110,70 135.43,70 135.43,96.46
Mechanical 16:
  lines w8: -135.43,-96.46 135.43,-96.46 ; -135.43,96.46 135.43,96.46
  lines w12: -75,25 -75,75 ; -25,-75 -25,-25 ; 25,25 25,75 ; 75,-75 75,-25

## SMDTOP6 [mil]
pads (6):
  rect 59.06x137.8 smd: 1(-125,100) 2(-75,-100) 3(-25,100) 4(25,-100) 5(75,100) 6(125,-100)
Top Overlay:
  lines w8: -185.43,-96.46 -185.43,96.46 ; 185.43,-96.46 185.43,-70 160,-70 160,70 185.43,70 185.43,96.46
Mechanical 16:
  lines w8: -185.43,-96.46 185.43,-96.46 ; -185.43,96.46 185.43,96.46
  lines w12: -125,25 -125,75 ; -75,-75 -75,-25 ; -25,25 -25,75 ; 25,-75 25,-25 ; 75,25 75,75 ; 125,-75 125,-25

## SMDTOP8 [mil]
pads (8):
  rect 59.06x137.8 smd: 1(-175,100) 2(-125,-100) 3(-75,100) 4(-25,-100) 5(25,100) 6(75,-100) 7(125,100) 8(175,-100)
Top Overlay:
  lines w8: -235.43,-96.46 -235.43,96.46 ; 235.43,-96.46 235.43,-70 210,-70 210,70 235.43,70 235.43,96.46
Mechanical 16:
  lines w8: -235.43,-96.46 235.43,-96.46 ; -235.43,96.46 235.43,96.46
  lines w12: -175,25 -175,75 ; -125,-75 -125,-25 ; -75,25 -75,75 ; -25,-75 -25,-25 ; 25,25 25,75 ; 75,-75 75,-25 ; 125,25 125,75 ; 175,-75 175,-25

## SMDTOP10 [mil]
pads (10):
  rect 59.06x137.8 smd: 1(-225,100) 2(-175,-100) 3(-125,100) 4(-75,-100) 5(-25,100) 6(25,-100) 7(75,100) 8(125,-100) 9(175,100) 10(225,-100)
Top Overlay:
  lines w8: -285.43,-96.46 -285.43,96.46 ; 285.43,-96.46 285.43,-70 260,-70 260,70 285.43,70 285.43,96.46
Mechanical 16:
  lines w8: -285.43,-96.46 285.43,-96.46 ; -285.43,96.46 285.43,96.46
  lines w12: -225,25 -225,75 ; -175,-75 -175,-25 ; -125,25 -125,75 ; -75,-75 -75,-25 ; -25,25 -25,75 ; 25,-75 25,-25 ; 75,25 75,75 ; 125,-75 125,-25 ; 175,25 175,75 ; 225,-75 225,-25

## SMDTOP12 [mil]
pads (12):
  rect 59.06x137.8 smd: 1(-275,100) 2(-225,-100) 3(-175,100) 4(-125,-100) 5(-75,100) 6(-25,-100) 7(25,100) 8(75,-100) 9(125,100) 10(175,-100) 11(225,100) 12(275,-100)
Top Overlay:
  lines w8: -335.43,-96.46 -335.43,96.46 ; 335.43,-96.46 335.43,-70 310,-70 310,70 335.43,70 335.43,96.46
Mechanical 16:
  lines w8: -335.43,-96.46 335.43,-96.46 ; -335.43,96.46 335.43,96.46
  lines w12: -275,25 -275,75 ; -225,-75 -225,-25 ; -175,25 -175,75 ; -125,-75 -125,-25 ; -75,25 -75,75 ; -25,-75 -25,-25 ; 25,25 25,75 ; 75,-75 75,-25 ; 125,25 125,75 ; 175,-75 175,-25 ; 225,25 225,75 ; 275,-75 275,-25

## SMDTOP14 [mil]
pads (14):
  rect 59.06x137.8 smd: 1(-325,100) 2(-275,-100) 3(-225,100) 4(-175,-100) 5(-125,100) 6(-75,-100) 7(-25,100) 8(25,-100) 9(75,100) 10(125,-100) 11(175,100) 12(225,-100) 13(275,100) 14(325,-100)
Top Overlay:
  lines w8: -385.43,-96.46 -385.43,96.46 ; 385.43,-96.46 385.43,-70 360,-70 360,70 385.43,70 385.43,96.46
Mechanical 16:
  lines w8: -385.43,-96.46 385.43,-96.46 ; -385.43,96.46 385.43,96.46
  lines w12: -325,25 -325,75 ; -275,-75 -275,-25 ; -225,25 -225,75 ; -175,-75 -175,-25 ; -125,25 -125,75 ; -75,-75 -75,-25 ; -25,25 -25,75 ; 25,-75 25,-25 ; 75,25 75,75 ; 125,-75 125,-25 ; 175,25 175,75 ; 225,-75 225,-25 ; 275,25 275,75 ; 325,-75 325,-25

## SMDTOP16 [mil]
pads (16):
  rect 59.06x137.8 smd: 1(-375,100) 2(-325,-100) 3(-275,100) 4(-225,-100) 5(-175,100) 6(-125,-100) 7(-75,100) 8(-25,-100) 9(25,100) 10(75,-100) 11(125,100) 12(175,-100) 13(225,100) 14(275,-100) 15(325,100) 16(375,-100)
Top Overlay:
  lines w8: -435.43,-96.46 -435.43,96.46 ; 435.43,-96.46 435.43,-70 410,-70 410,70 435.43,70 435.43,96.46
Mechanical 16:
  lines w8: -435.43,-96.46 435.43,-96.46 ; -435.43,96.46 435.43,96.46
  lines w12: -375,25 -375,75 ; -325,-75 -325,-25 ; -275,25 -275,75 ; -225,-75 -225,-25 ; -175,25 -175,75 ; -125,-75 -125,-25 ; -75,25 -75,75 ; -25,-75 -25,-25 ; 25,25 25,75 ; 75,-75 75,-25 ; 125,25 125,75 ; 175,-75 175,-25 ; 225,25 225,75 ; 275,-75 275,-25 ; 325,25 325,75 ; 375,-75 375,-25

## SMDTOP18 [mil]
pads (18):
  rect 59.06x137.8 smd: 1(-425,100) 2(-375,-100) 3(-325,100) 4(-275,-100) 5(-225,100) 6(-175,-100) 7(-125,100) 8(-75,-100) 9(-25,100) 10(25,-100) 11(75,100) 12(125,-100) 13(175,100) 14(225,-100) 15(275,100) 16(325,-100) 17(375,100) 18(425,-100)
Top Overlay:
  lines w8: -485.43,-96.46 -485.43,96.46 ; 485.43,-96.46 485.43,-70 460,-70 460,70 485.43,70 485.43,96.46
Mechanical 16:
  lines w8: -485.43,-96.46 485.43,-96.46 ; -485.43,96.46 485.43,96.46
  lines w12: -425,25 -425,75 ; -375,-75 -375,-25 ; -325,25 -325,75 ; -275,-75 -275,-25 ; -225,25 -225,75 ; -175,-75 -175,-25 ; -125,25 -125,75 ; -75,-75 -75,-25 ; -25,25 -25,75 ; 25,-75 25,-25 ; 75,25 75,75 ; 125,-75 125,-25 ; 175,25 175,75 ; 225,-75 225,-25 ; 275,25 275,75 ; 325,-75 325,-25 ; 375,25 375,75 ; 425,-75 425,-25

## SMDTOP20 [mil]
pads (20):
  rect 59.06x137.8 smd: 1(-475,100) 2(-425,-100) 3(-375,100) 4(-325,-100) 5(-275,100) 6(-225,-100) 7(-175,100) 8(-125,-100) 9(-75,100) 10(-25,-100) 11(25,100) 12(75,-100) 13(125,100) 14(175,-100) 15(225,100) 16(275,-100) 17(325,100) 18(375,-100) 19(425,100) 20(475,-100)
Top Overlay:
  lines w8: -535.43,-96.46 -535.43,96.46 ; 535.43,-96.46 535.43,-70 510,-70 510,70 535.43,70 535.43,96.46
Mechanical 16:
  lines w8: -535.43,-96.46 535.43,-96.46 ; -535.43,96.46 535.43,96.46
  lines w12: -475,25 -475,75 ; -425,-75 -425,-25 ; -375,25 -375,75 ; -325,-75 -325,-25 ; -275,25 -275,75 ; -225,-75 -225,-25 ; -175,25 -175,75 ; -125,-75 -125,-25 ; -75,25 -75,75 ; -25,-75 -25,-25 ; 25,25 25,75 ; 75,-75 75,-25 ; 125,25 125,75 ; 175,-75 175,-25 ; 225,25 225,75 ; 275,-75 275,-25 ; 325,25 325,75 ; 375,-75 375,-25 ; 425,25 425,75 ; 475,-75 475,-25

## USB [mm]
pads (6):
  round 2.3 hole 2.3: 1(-6.57,10.28) 1(6.57,10.28)
  round 1.5 hole 1: 1(-3.5,12.99) 2(-1,12.99) 3(1,12.99) 4(3.5,12.99)
Top Overlay:
  lines w0.203: -7,0 -6.8,0 ccw(c-6.8,0.3) -6.5,0.3 ; -5,8 -4,2 -3,2 -2,8 ; 2,8 3,2 4,2 5,8 ; 7,0 6.8,0 cw(c6.8,0.3) 6.5,0.3 ; -6.5,0.3 -6.5,0.3 ; -6.5,0.3 -6.2,0.3 cw(c-6.2,0) -5.9,0 5.9,0 cw(c6.2,0) 6.2,0.3 6.5,0.3 ; -6.5,0.3 -6.5,9 ; -6.5,9 -6.5,11.5 ; -6.5,9 -8,9.5 -8,11 -6.5,11.5 ; -6.5,11.5 -6.5,13.9 6.5,13.9 6.5,11.5 ; 6.5,0.3 6.5,9 ; 6.5,9 6.5,11.5 ; 6.5,9 8,9.5 8,11 6.5,11.5
  text "AMP 787616-1" at -5.08,0.635 h1.57